# Altium footprint library SparkFun-Retired.PCBLIB: 302 footprints (part 9 of 19)
Each footprint in its own frame and in the unit in brackets; x right, y up, seen from the top. Pads: shape width x height; smd on the part's side, far side on the other; paste and mask are expansions set on the pad; w line width, h text height; cw(c..) or ccw(c..) is an arc to the next point about the centre after c.
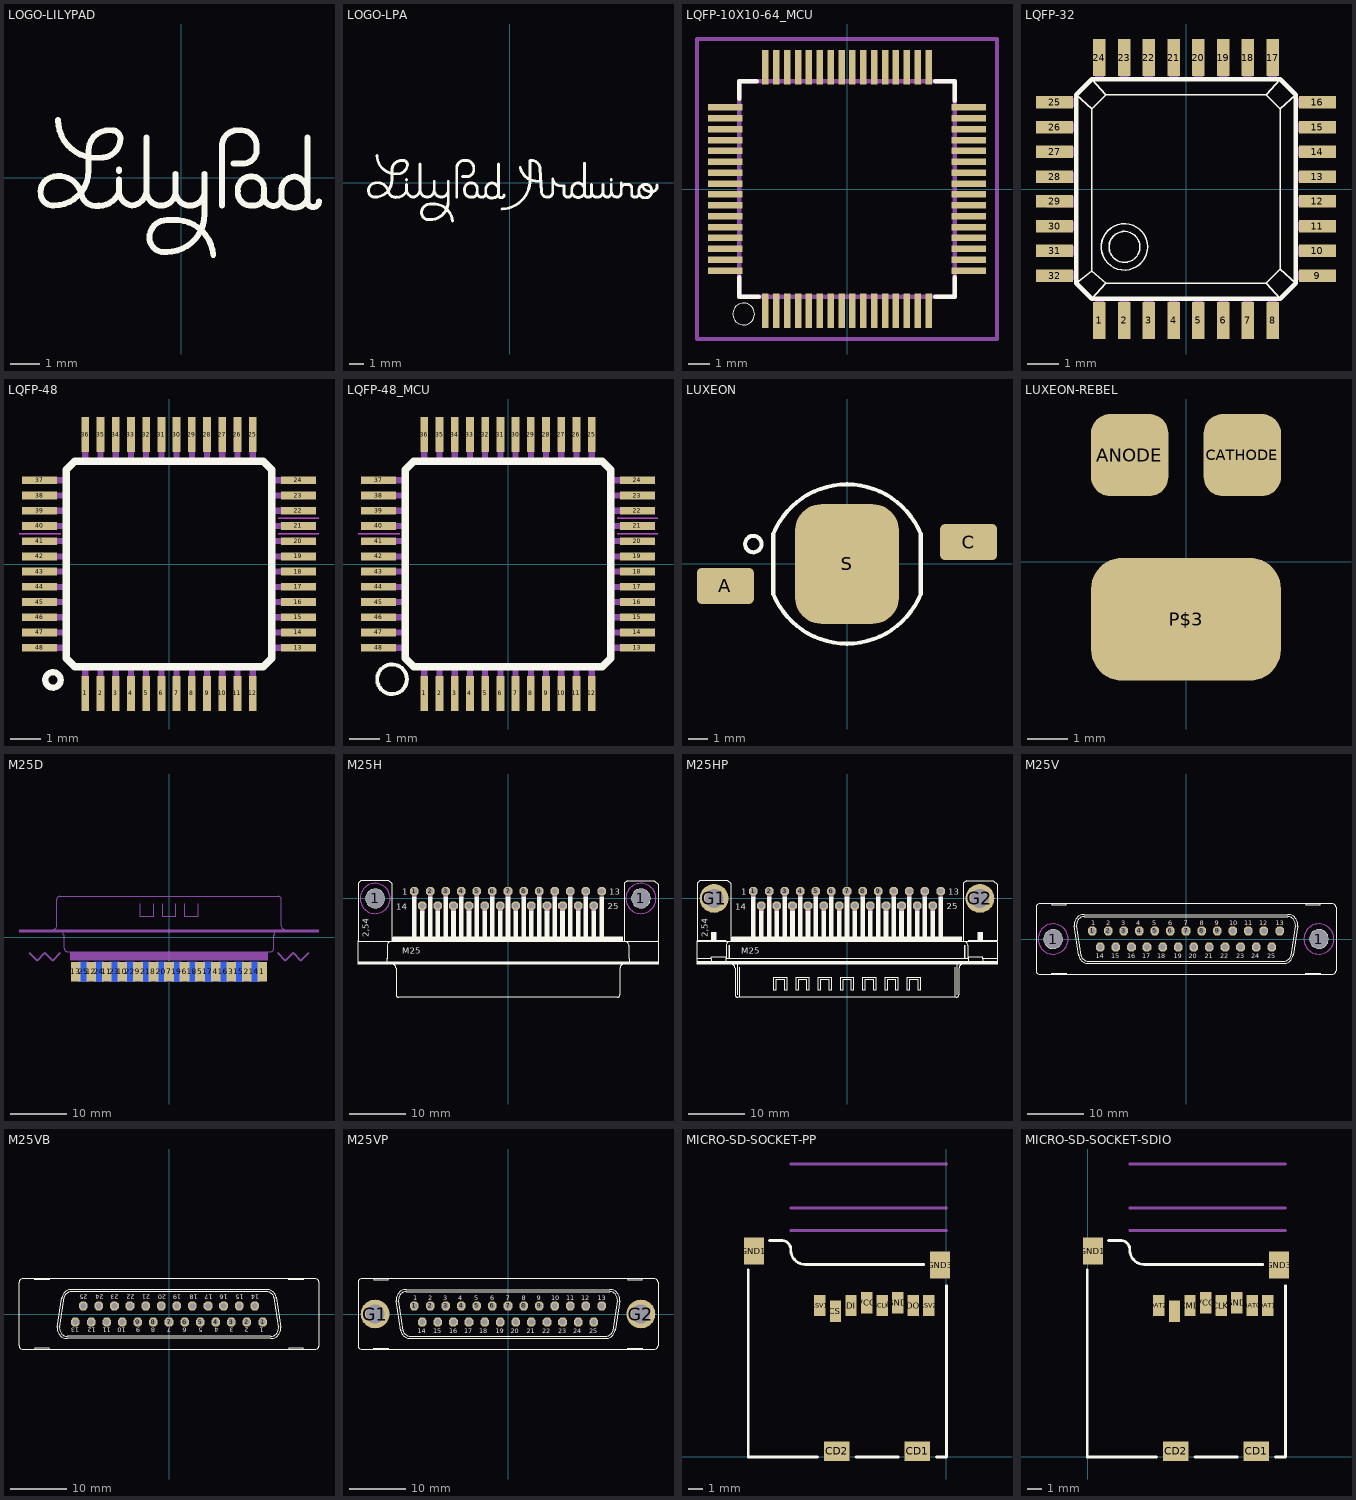
[diagram p8: the footprints below, top view; thin cyan lines are the x and y axes]

## LOGO-LILYPAD [mil]
Top Overlay:
  lines w8: -166.93,78.15 ccw(c-115.75,78.15) -115.75,26.97 -109.84,26.97 ccw(c-108.86,53.55) -82.28,52.56 ccw(c-94.09,52.56) -94.09,64.37 -98.03,64.37 ccw(c-98.03,36.81) -125.59,36.81 -125.59,9.25 cw(c-172.83,9.25) -172.83,-37.99 cw(c-173.81,-21.25) -190.55,-22.24 cw(c-169.88,-19.29) -172.83,1.38 cw(c-165.94,-29.13) -135.43,-22.24 ccw(c-115.75,-18.3) -111.81,-37.99 ; -125.59,-36.02 ccw(c-112.79,-7.48) -84.25,-20.28 -84.25,-14.37 ; -84.25,-2.56 -84.25,-14.37 ; -84.25,9.25 -84.25,11.22 ; -46.85,54.53 -46.85,-10.43 cw(c-85.26,-13.38) -46.85,-16.34 ; -7.48,5.32 -7.48,-18.31 ; 31.89,5.32 31.89,-18.31 ; 43.7,-104.92 ccw(c-7.48,-108.86) -11.42,-57.68 -19.29,-57.68 ccw(c-19.29,-81.3) -42.91,-81.3 ccw(c-23.23,-81.3) -23.23,-100.98 -19.29,-100.98 ccw(c-19.29,-49.8) 31.89,-49.8 31.89,-18.31 ; 55.51,-37.99 55.51,44.69 cw(c77.16,42.72) 79.13,64.37 cw(c81.1,42.71) 102.76,44.69 102.76,36.81 cw(c84.05,37.8) 83.07,19.09 71.26,19.09 ; 171.65,-24.21 171.65,54.53 ; 187.4,-32.09 cw(c179.53,-32.09) 179.53,-39.96 cw(c179.53,-32.09) 171.65,-32.09 171.65,-28.15 ; -84.25,-14.37 ccw(c-63.59,-17.32) -66.54,-37.99 ccw(c-69.32,-15.68) -46.85,-16.34 ; -46.85,-16.34 -46.85,-18.31 ccw(c-27.17,-18.31) -27.17,-37.99 ccw(c-27.16,-18.3) -7.48,-18.31 ; -7.48,-18.31 ccw(c12.2,-18.31) 12.2,-37.99 ccw(c12.21,-18.3) 31.89,-18.31 ; 112.6,-22.24 cw(c98.82,-24.21) 100.79,-37.99 92.91,-37.99 cw(c94.88,-20.28) 77.17,-18.31 cw(c94.89,-16.34) 92.91,1.38 96.85,1.38 cw(c96.85,-14.37) 112.6,-14.37 112.6,-22.24 ; 112.6,-22.24 ccw(c125.39,-25.2) 122.44,-37.99 ccw(c125.39,-27.16) 136.22,-30.12 136.22,-28.15 ; 136.22,-28.15 136.22,-18.31 cw(c154.93,-17.32) 153.94,1.38 cw(c151.97,-18.3) 171.65,-20.28 cw(c155.91,-24.21) 171.65,-28.15 ; 136.22,-28.15 ccw(c153.94,-22.25) 159.84,-39.96 ccw(c155.9,-24.21) 171.65,-28.15

## LOGO-LPA [mil]
Top Overlay:
  lines w8: -370.87,76.77 ccw(c-319.69,76.77) -319.69,25.59 -313.78,25.59 ccw(c-312.8,52.16) -286.22,51.18 ccw(c-298.03,51.18) -298.03,62.99 -301.97,62.99 ccw(c-301.97,35.43) -329.53,35.43 -329.53,7.87 cw(c-376.77,7.87) -376.77,-39.37 cw(c-377.75,-22.64) -394.49,-23.62 cw(c-373.82,-20.67) -376.77,0 cw(c-369.88,-30.51) -339.37,-23.62 ccw(c-319.69,-19.68) -315.75,-39.37 ; -329.53,-37.4 ccw(c-316.74,-8.86) -288.19,-21.65 -288.19,-15.75 ; -288.19,-3.94 -288.19,-15.75 ; -288.19,7.87 -288.19,9.84 ; -250.79,53.15 -250.79,-11.81 cw(c-289.2,-14.77) -250.79,-17.72 ; -211.42,3.94 -211.42,-19.69 ; -172.05,3.94 -172.05,-19.69 ; -160.24,-106.3 ccw(c-211.41,-110.23) -215.35,-59.06 -223.23,-59.06 ccw(c-223.23,-82.68) -246.85,-82.68 ccw(c-227.17,-82.68) -227.17,-102.36 -223.23,-102.36 ccw(c-223.23,-51.18) -172.05,-51.18 -172.05,-19.69 ; -148.43,-39.37 -148.43,43.31 cw(c-126.78,41.34) -124.8,62.99 cw(c-122.83,41.34) -101.18,43.31 -101.18,35.43 cw(c-119.88,36.42) -120.87,17.72 -132.68,17.72 ; -32.28,-25.59 -32.28,53.15 ; -22.44,-72.83 ccw(c-25.39,8.86) 56.3,11.81 56.3,62.99 60.24,62.99 cw(c60.24,39.37) 83.86,39.37 87.8,-23.62 ccw(c103.55,-23.62) 103.54,-39.37 ccw(c105.51,-25.59) 119.29,-27.56 119.29,11.81 ccw(c140.94,13.78) 142.91,-7.87 150.79,-7.87 150.79,-29.53 ccw(c160.63,-29.53) 160.63,-39.37 ; -16.54,-33.46 cw(c-24.41,-33.47) -24.41,-41.34 cw(c-24.41,-33.47) -32.28,-33.46 -32.28,-29.53 ; 28.74,43.31 ccw(c75.98,53.16) 85.83,5.91 ; 162.6,-39.37 ccw(c162.6,-29.53) 172.44,-29.53 172.44,-27.56 ; 207.87,-23.62 207.87,55.12 ; 227.56,-31.5 cw(c219.69,-31.5) 219.69,-39.37 cw(c217.72,-29.52) 207.87,-31.5 207.87,-27.56 ; 227.56,-3.94 227.56,-27.56 ccw(c242.32,-24.61) 245.28,-39.37 ccw(c244.29,-24.61) 259.06,-23.62 ; 259.06,-3.94 259.06,-23.62 ; 282.68,-3.94 282.68,-21.65 ; 282.68,7.87 282.68,9.84 ; 310.24,0 310.24,-27.56 ; 359.45,-27.56 cw(c349.61,-29.52) 351.57,-39.37 345.67,-39.37 cw(c347.63,-31.5) 339.76,-29.53 339.76,-13.78 ccw(c328.94,-14.77) 327.95,-3.94 322.05,-3.94 ccw(c322.05,-15.75) 310.24,-15.75 310.24,-27.56 ; 369.29,-5.91 ccw(c390.94,-1.97) 394.88,-23.62 ; 410.63,-5.91 410.63,-11.81 cw(c395.87,-8.86) 392.91,-23.62 394.88,-23.62 ; -288.19,-15.75 ccw(c-267.52,-18.7) -270.47,-39.37 ccw(c-273.25,-17.07) -250.79,-17.72 ; -250.79,-17.72 -250.79,-19.69 ccw(c-231.1,-19.68) -231.1,-39.37 ccw(c-231.1,-19.69) -211.42,-19.69 ; -211.42,-19.69 ccw(c-191.74,-19.68) -191.73,-39.37 ccw(c-191.73,-19.69) -172.05,-19.69 ; -91.34,-23.62 cw(c-105.12,-25.59) -103.15,-39.37 -111.02,-39.37 cw(c-109.06,-21.66) -126.77,-19.69 cw(c-109.05,-17.72) -111.02,0 -107.09,0 cw(c-107.09,-15.75) -91.34,-15.75 -91.34,-23.62 ; -91.34,-23.62 ccw(c-78.55,-26.57) -81.5,-39.37 ccw(c-78.55,-28.55) -67.72,-31.5 -67.72,-29.53 ; -67.72,-29.53 -67.72,-19.69 cw(c-49.02,-18.7) -50,0 cw(c-51.97,-19.68) -32.28,-21.65 cw(c-48.04,-25.59) -32.28,-29.53 ; -67.72,-29.53 ccw(c-50,-23.62) -44.09,-41.34 ccw(c-48.03,-25.59) -32.28,-29.53 ; 172.44,-27.56 172.44,-17.72 cw(c190.16,-17.72) 190.16,0 cw(c189.17,-18.7) 207.87,-19.69 cw(c192.13,-23.62) 207.87,-27.56 ; 172.44,-27.56 ccw(c190.16,-21.66) 196.06,-39.37 ccw(c192.12,-23.62) 207.87,-27.56 ; 259.06,-23.62 ccw(c272.84,-25.59) 270.87,-39.37 ccw(c270.87,-27.56) 282.68,-27.56 282.68,-21.65 ; 282.68,-21.65 282.68,-23.62 ccw(c298.43,-23.62) 298.43,-39.37 ccw(c298.43,-27.56) 310.24,-27.56 ; 394.88,-23.62 394.88,-19.69 ccw(c379.13,-19.69) 379.13,-3.94 375.2,-3.94 ccw(c377.17,-21.66) 359.45,-23.62 ccw(c376.19,-24.61) 375.2,-41.34 379.13,-41.34 ccw(c378.14,-24.61) 394.88,-23.62

## LQFP-10X10-64_MCU [mil]
pads (64):
  rect 11.81x62.99 smd: 1(-147.64,-220.47) 2(-127.95,-220.47) 3(-108.27,-220.47) 4(-88.58,-220.47) 5(-68.9,-220.47) 6(-49.21,-220.47) 7(-29.53,-220.47) 8(-9.84,-220.47) 9(9.84,-220.47) 10(29.53,-220.47) 11(49.21,-220.47) 12(68.9,-220.47) 13(88.58,-220.47) 14(108.27,-220.47) 15(127.95,-220.47) 16(147.64,-220.47) 33(147.64,220.47) 34(127.95,220.47) 35(108.27,220.47) 36(88.58,220.47) 37(68.9,220.47) 38(49.21,220.47) 39(29.53,220.47) 40(9.84,220.47) 41(-9.84,220.47) 42(-29.53,220.47) 43(-49.21,220.47) 44(-68.9,220.47) 45(-88.58,220.47) 46(-108.27,220.47) 47(-127.95,220.47) 48(-147.64,220.47)
  rect 62.99x11.81 smd: 17(220.47,-147.64) 18(220.47,-127.95) 19(220.47,-108.27) 20(220.47,-88.58) 21(220.47,-68.9) 22(220.47,-49.21) 23(220.47,-29.53) 24(220.47,-9.84) 25(220.47,9.84) 26(220.47,29.53) 27(220.47,49.21) 28(220.47,68.9) 29(220.47,88.58) 30(220.47,108.27) 31(220.47,127.95) 32(220.47,147.64) 49(-220.47,147.64) 50(-220.47,127.95) 51(-220.47,108.27) 52(-220.47,88.58) 53(-220.47,68.9) 54(-220.47,49.21) 55(-220.47,29.53) 56(-220.47,9.84) 57(-220.47,-9.84) 58(-220.47,-29.53) 59(-220.47,-49.21) 60(-220.47,-68.9) 61(-220.47,-88.58) 62(-220.47,-108.27) 63(-220.47,-127.95) 64(-220.47,-147.64)
Top Overlay:
  circle w0: c-187.01,-226.38 r19.69
  lines w8: -194.88,-159.45 -194.88,-194.88 -159.45,-194.88 ; -194.88,163.39 -194.88,194.88 -163.39,194.88 ; 159.45,-194.88 194.88,-194.88 194.88,-159.45 ; 159.45,194.88 194.88,194.88 194.88,159.45
Top Paste:
  rectangle: -238.9,142.3 -198.7,153
  rectangle: -248.3,122.6 -208.1,133.3
  rectangle: -238.9,102.9 -198.7,113.6
  rectangle: -248.3,83.2 -208.1,93.9
  rectangle: -238.9,63.6 -198.7,74.3
  rectangle: -248.3,43.9 -208.1,54.6
  rectangle: -238.9,24.4 -198.7,35.1
  rectangle: -248.3,4.7 -208.1,15.4
  rectangle: -238.9,-15.2 -198.7,-4.5
  rectangle: -248.3,-34.9 -208.1,-24.2
  rectangle: -238.9,-54.5 -198.7,-43.8
  rectangle: -248.3,-74.2 -208.1,-63.5
  rectangle: -238.9,-93.9 -198.7,-83.2
  rectangle: -248.3,-113.6 -208.1,-102.9
  rectangle: -238.9,-133.2 -198.7,-122.5
  rectangle: -248.3,-152.9 -208.1,-142.2
  rectangle: 208.2,142.2 248.4,152.9
  rectangle: 198.8,122.5 239,133.2
  rectangle: 208.2,102.8 248.4,113.5
  rectangle: 198.8,83.1 239,93.8
  rectangle: 208.2,63.5 248.4,74.2
  rectangle: 198.8,43.8 239,54.5
  rectangle: 208.2,24.3 248.4,35
  rectangle: 198.8,4.6 239,15.3
  rectangle: 208.2,-15.3 248.4,-4.6
  rectangle: 198.8,-35 239,-24.3
  rectangle: 208.2,-54.6 248.4,-43.9
  rectangle: 198.8,-74.3 239,-63.6
  rectangle: 208.2,-94 248.4,-83.3
  rectangle: 198.8,-113.7 239,-103
  rectangle: 208.2,-133.3 248.4,-122.6
  rectangle: 198.8,-153 239,-142.3
  region: -142.2,208.4 -142.2,248.6 -152.9,248.6 -152.9,208.4
  region: -122.5,199 -122.5,239.2 -133.2,239.2 -133.2,199
  region: -102.8,208.4 -102.8,248.6 -113.5,248.6 -113.5,208.4
  region: -83.1,199 -83.1,239.2 -93.8,239.2 -93.8,199
  region: -63.5,208.4 -63.5,248.6 -74.2,248.6 -74.2,208.4
  region: -43.8,199 -43.8,239.2 -54.5,239.2 -54.5,199
  region: -24.3,208.4 -24.3,248.6 -35,248.6 -35,208.4
  region: -4.6,199 -4.6,239.2 -15.3,239.2 -15.3,199
  region: 15.3,208.4 15.3,248.6 4.6,248.6 4.6,208.4
  region: 35,199 35,239.2 24.3,239.2 24.3,199
  region: 54.6,208.4 54.6,248.6 43.9,248.6 43.9,208.4
  region: 74.3,199 74.3,239.2 63.6,239.2 63.6,199
  region: 94,208.4 94,248.6 83.3,248.6 83.3,208.4
  region: 113.7,199 113.7,239.2 103,239.2 103,199
  region: 133.3,208.4 133.3,248.6 122.6,248.6 122.6,208.4
  region: 153,199 153,239.2 142.3,239.2 142.3,199
  region: -142.3,-237.5 -142.3,-197.3 -153,-197.3 -153,-237.5
  region: -122.6,-246.9 -122.6,-206.7 -133.3,-206.7 -133.3,-246.9
  region: -102.9,-237.5 -102.9,-197.3 -113.6,-197.3 -113.6,-237.5
  region: -83.2,-246.9 -83.2,-206.7 -93.9,-206.7 -93.9,-246.9
  region: -63.6,-237.5 -63.6,-197.3 -74.3,-197.3 -74.3,-237.5
  region: -43.9,-246.9 -43.9,-206.7 -54.6,-206.7 -54.6,-246.9
  region: -24.4,-237.5 -24.4,-197.3 -35.1,-197.3 -35.1,-237.5
  region: -4.7,-246.9 -4.7,-206.7 -15.4,-206.7 -15.4,-246.9
  region: 15.2,-237.5 15.2,-197.3 4.5,-197.3 4.5,-237.5
  region: 34.9,-246.9 34.9,-206.7 24.2,-206.7 24.2,-246.9
  region: 54.5,-237.5 54.5,-197.3 43.8,-197.3 43.8,-237.5
  region: 74.2,-246.9 74.2,-206.7 63.5,-206.7 63.5,-246.9
  region: 93.9,-237.5 93.9,-197.3 83.2,-197.3 83.2,-237.5
  region: 113.6,-246.9 113.6,-206.7 102.9,-206.7 102.9,-246.9
  region: 133.2,-237.5 133.2,-197.3 122.5,-197.3 122.5,-237.5
  region: 152.9,-246.9 152.9,-206.7 142.2,-206.7 142.2,-246.9
Mechanical 16:
  rectangle: 6.5,-233.27 13.19,-194.88
  rectangle: 194.88,6.5 233.27,13.19
  rectangle: 6.5,194.88 13.19,233.27
  rectangle: -233.27,6.5 -194.88,13.19
  rectangle: -13.19,194.88 -6.5,233.27
  rectangle: -32.87,194.88 -26.18,233.27
  rectangle: 26.18,194.88 32.87,233.27
  rectangle: 45.87,194.88 52.56,233.27
  rectangle: 65.55,194.88 72.24,233.27
  rectangle: 85.24,194.88 91.93,233.27
  rectangle: 104.92,194.88 111.61,233.27
  rectangle: 124.61,194.88 131.3,233.27
  rectangle: 144.29,194.88 150.98,233.27
  rectangle: -52.56,194.88 -45.87,233.27
  rectangle: -72.24,194.88 -65.55,233.27
  rectangle: -91.93,194.88 -85.24,233.27
  rectangle: -111.61,194.88 -104.92,233.27
  rectangle: -131.3,194.88 -124.61,233.27
  rectangle: -150.98,194.88 -144.29,233.27
  rectangle: 194.88,26.18 233.27,32.87
  rectangle: 194.88,45.87 233.27,52.56
  rectangle: 194.88,65.55 233.27,72.24
  rectangle: 194.88,85.24 233.27,91.93
  rectangle: 194.88,104.92 233.27,111.61
  rectangle: 194.88,124.61 233.27,131.3
  rectangle: 194.88,144.29 233.27,150.98
  rectangle: 194.88,-13.19 233.27,-6.5
  rectangle: 194.88,-32.87 233.27,-26.18
  rectangle: 194.88,-52.56 233.27,-45.87
  rectangle: 194.88,-72.24 233.27,-65.55
  rectangle: 194.88,-91.93 233.27,-85.24
  rectangle: 194.88,-111.61 233.27,-104.92
  rectangle: 194.88,-131.3 233.27,-124.61
  rectangle: 194.88,-150.98 233.27,-144.29
  rectangle: -13.19,-233.27 -6.5,-194.88
  rectangle: -32.87,-233.27 -26.18,-194.88
  rectangle: -52.56,-233.27 -45.87,-194.88
  rectangle: -72.24,-233.27 -65.55,-194.88
  rectangle: -150.98,-233.27 -144.29,-194.88
  rectangle: -131.3,-233.27 -124.61,-194.88
  rectangle: -111.61,-233.27 -104.92,-194.88
  rectangle: -91.93,-233.27 -85.24,-194.88
  rectangle: 26.18,-233.27 32.87,-194.88
  rectangle: 45.87,-233.27 52.56,-194.88
  rectangle: 144.29,-233.27 150.98,-194.88
  rectangle: 124.61,-233.27 131.3,-194.88
  rectangle: 104.92,-233.27 111.61,-194.88
  rectangle: 85.24,-233.27 91.93,-194.88
  rectangle: 65.55,-233.27 72.24,-194.88
  rectangle: -233.27,144.29 -194.88,150.98
  rectangle: -233.27,-150.98 -194.88,-144.29
  rectangle: -233.27,-131.3 -194.88,-124.61
  rectangle: -233.27,-111.61 -194.88,-104.92
  rectangle: -233.27,-91.93 -194.88,-85.24
  rectangle: -233.27,-72.24 -194.88,-65.55
  rectangle: -233.27,-52.56 -194.88,-45.87
  rectangle: -233.27,-32.87 -194.88,-26.18
  rectangle: -233.27,-13.19 -194.88,-6.5
  rectangle: -233.27,26.18 -194.88,32.87
  rectangle: -233.27,124.61 -194.88,131.3
  rectangle: -233.27,104.92 -194.88,111.61
  rectangle: -233.27,85.24 -194.88,91.93
  rectangle: -233.27,65.55 -194.88,72.24
  rectangle: -233.27,45.87 -194.88,52.56
  lines w8: -194.88,-194.88 194.88,-194.88 194.88,194.88 -194.88,194.88 -194.88,-194.88
Mechanical 27:
  lines w7.87: -271.65,-271.65 -271.65,271.65 271.65,271.65 271.65,-271.65 -271.65,-271.65

## LQFP-32 [mm]
pads (32):
  rect 0.4x1.2 smd: 1(-2.8,-4.25) 2(-2,-4.25) 3(-1.2,-4.25) 4(-0.4,-4.25) 5(0.4,-4.25) 6(1.2,-4.25) 7(2,-4.25) 8(2.8,-4.25) 17(2.8,4.25) 18(2,4.25) 19(1.2,4.25) 20(0.4,4.25) 21(-0.4,4.25) 22(-1.2,4.25) 23(-2,4.25) 24(-2.8,4.25)
  rect 1.2x0.4 smd: 9(4.25,-2.8) 10(4.25,-2) 11(4.25,-1.2) 12(4.25,-0.4) 13(4.25,0.4) 14(4.25,1.2) 15(4.25,2) 16(4.25,2.8) 25(-4.25,2.8) 26(-4.25,2) 27(-4.25,1.2) 28(-4.25,0.4) 29(-4.25,-0.4) 30(-4.25,-1.2) 31(-4.25,-2) 32(-4.25,-2.8)
Top Overlay:
  circle w0.051: c-1.99,-1.871 r0.75
  circle w0.051: c-1.99,-1.871 r0.5
  lines w0.051: -3.55,-3.05 -3.05,-2.65 ; -3.55,3.05 -3.05,2.59 ; -3.05,-3.55 -2.59,-3.05 ; -3.05,3.55 -2.59,3.05 ; 3.05,-3.55 2.59,-3.05 ; 3.05,3.55 2.59,3.05 ; 3.55,-3.05 3.05,-2.59 ; 3.55,3.05 3.05,2.59 ; -3.05,-2.65 -3.05,2.59 ; -3.05,-2.65 -2.59,-3.05 ; -3.05,2.59 -2.59,3.05 ; -2.59,-3.05 2.59,-3.05 ; -2.59,3.05 2.59,3.05 ; 2.59,-3.05 3.05,-2.59 ; 2.59,3.05 3.05,2.59 ; 3.05,-2.59 3.05,2.59
  lines w0.152: -3.55,-3.05 -3.05,-3.55 3.05,-3.55 3.55,-3.05 3.55,3.05 3.05,3.55 -3.05,3.55 -3.55,3.05 -3.55,-3.05
Mechanical 16:
  rectangle: -2.95,3.55 -2.65,4.5
  rectangle: -2.15,3.55 -1.85,4.5
  rectangle: -1.35,3.55 -1.05,4.5
  rectangle: -0.55,3.55 -0.25,4.5
  rectangle: 0.25,3.55 0.55,4.5
  rectangle: 1.05,3.55 1.35,4.5
  rectangle: 1.85,3.55 2.15,4.5
  rectangle: 2.65,3.55 2.95,4.5
  rectangle: 3.55,2.65 4.5,2.95
  rectangle: 3.55,1.85 4.5,2.15
  rectangle: 3.55,1.05 4.5,1.35
  rectangle: 3.55,0.25 4.5,0.55
  rectangle: 3.55,-0.55 4.5,-0.25
  rectangle: 3.55,-1.35 4.5,-1.05
  rectangle: 3.55,-2.15 4.5,-1.85
  rectangle: 3.55,-2.95 4.5,-2.65
  rectangle: 2.65,-4.5 2.95,-3.55
  rectangle: 1.85,-4.5 2.15,-3.55
  rectangle: 1.05,-4.5 1.35,-3.55
  rectangle: 0.25,-4.5 0.55,-3.55
  rectangle: -0.55,-4.5 -0.25,-3.55
  rectangle: -1.35,-4.5 -1.05,-3.55
  rectangle: -2.15,-4.5 -1.85,-3.55
  rectangle: -2.95,-4.5 -2.65,-3.55
  rectangle: -4.5,-2.95 -3.55,-2.65
  rectangle: -4.5,-2.15 -3.55,-1.85
  rectangle: -4.5,-1.35 -3.55,-1.05
  rectangle: -4.5,-0.6 -3.55,-0.25
  rectangle: -4.5,0.2 -3.55,0.55
  rectangle: -4.5,1.05 -3.55,1.35
  rectangle: -4.5,1.85 -3.55,2.15
  rectangle: -4.5,2.65 -3.55,2.95

## LQFP-48 [mil]
pads (48):
  rect 10x45 smd: 1(-108.27,-167.32) 2(-88.58,-167.32) 3(-68.9,-167.32) 4(-49.21,-167.32) 5(-29.53,-167.32) 6(-9.84,-167.32) 7(9.84,-167.32) 8(29.53,-167.32) 9(49.21,-167.32) 10(68.9,-167.32) 11(88.58,-167.32) 12(108.27,-167.32) 25(108.27,167.32) 26(88.58,167.32) 27(68.9,167.32) 28(49.21,167.32) 29(29.53,167.32) 30(9.84,167.32) 31(-9.84,167.32) 32(-29.53,167.32) 33(-49.21,167.32) 34(-68.9,167.32) 35(-88.58,167.32) 36(-108.27,167.32)
  rect 45x10 smd: 13(167.32,-108.27) 14(167.32,-88.58) 15(167.32,-68.9) 16(167.32,-49.21) 17(167.32,-29.53) 18(167.32,-9.84) 19(167.32,9.84) 20(167.32,29.53) 21(167.32,49.21) 22(167.32,68.9) 23(167.32,88.58) 24(167.32,108.27) 37(-167.32,108.27) 38(-167.32,88.58) 39(-167.32,68.9) 40(-167.32,49.21) 41(-167.32,29.53) 42(-167.32,9.84) 43(-167.32,-9.84) 44(-167.32,-29.53) 45(-167.32,-49.21) 46(-167.32,-68.9) 47(-167.32,-88.58) 48(-167.32,-108.27)
Top Overlay:
  circle w8: c-150,-150 r10
  lines w10: -132.87,-122.05 -122.05,-132.87 122.05,-132.87 132.87,-122.05 132.87,122.05 122.05,132.87 -122.05,132.87 -132.87,122.05 -132.87,-122.05
Mechanical 8 keep-out:
  rectangle: 141,58 194,60
  rectangle: 141,38 194,40
  rectangle: -194,38 -140,40
Mechanical 16:
  rectangle: -112.2,-177.17 -104.33,-135.83
  rectangle: -92.52,-177.17 -84.65,-135.83
  rectangle: -72.83,-177.17 -64.96,-135.83
  rectangle: -53.15,-177.17 -45.28,-135.83
  rectangle: -33.46,-177.17 -25.59,-135.83
  rectangle: -13.78,-177.17 -5.91,-135.83
  rectangle: 5.91,-177.17 13.78,-135.83
  rectangle: 25.59,-177.17 33.46,-135.83
  rectangle: 45.28,-177.17 53.15,-135.83
  rectangle: 64.96,-177.17 72.83,-135.83
  rectangle: 84.65,-177.17 92.52,-135.83
  rectangle: 104.33,-177.17 112.2,-135.83
  rectangle: 135.83,-112.2 177.17,-104.33
  rectangle: 135.83,-92.52 177.17,-84.65
  rectangle: 135.83,-72.83 177.17,-64.96
  rectangle: 135.83,-53.15 177.17,-45.28
  rectangle: 135.83,-33.46 177.17,-25.59
  rectangle: 135.83,-13.78 177.17,-5.91
  rectangle: 135.83,5.91 177.17,13.78
  rectangle: 135.83,25.59 177.17,33.46
  rectangle: 135.83,45.28 177.17,53.15
  rectangle: 135.83,64.96 177.17,72.83
  rectangle: 135.83,84.65 177.17,92.52
  rectangle: 135.83,104.33 177.17,112.2
  rectangle: 104.33,135.83 112.2,177.17
  rectangle: 84.65,135.83 92.52,177.17
  rectangle: 64.96,135.83 72.83,177.17
  rectangle: 45.28,135.83 53.15,177.17
  rectangle: 25.59,135.83 33.46,177.17
  rectangle: 5.91,135.83 13.78,177.17
  rectangle: -13.78,135.83 -5.91,177.17
  rectangle: -33.46,135.83 -25.59,177.17
  rectangle: -53.15,135.83 -45.28,177.17
  rectangle: -72.83,135.83 -64.96,177.17
  rectangle: -92.52,135.83 -84.65,177.17
  rectangle: -112.2,135.83 -104.33,177.17
  rectangle: -177.17,104.33 -135.83,112.2
  rectangle: -177.17,84.65 -135.83,92.52
  rectangle: -177.17,64.96 -135.83,72.83
  rectangle: -177.17,45.28 -135.83,53.15
  rectangle: -177.17,25.59 -135.83,33.46
  rectangle: -177.17,5.91 -135.83,13.78
  rectangle: -177.17,-13.78 -135.83,-5.91
  rectangle: -177.17,-33.46 -135.83,-25.59
  rectangle: -177.17,-53.15 -135.83,-45.28
  rectangle: -177.17,-72.83 -135.83,-64.96
  rectangle: -177.17,-92.52 -135.83,-84.65
  rectangle: -177.17,-112.2 -135.83,-104.33

## LQFP-48_MCU [mil]
pads (48):
  rect 10x45 smd: 1(-108.27,-167.32) 2(-88.58,-167.32) 3(-68.9,-167.32) 4(-49.21,-167.32) 5(-29.53,-167.32) 6(-9.84,-167.32) 7(9.84,-167.32) 8(29.53,-167.32) 9(49.21,-167.32) 10(68.9,-167.32) 11(88.58,-167.32) 12(108.27,-167.32) 25(108.27,167.32) 26(88.58,167.32) 27(68.9,167.32) 28(49.21,167.32) 29(29.53,167.32) 30(9.84,167.32) 31(-9.84,167.32) 32(-29.53,167.32) 33(-49.21,167.32) 34(-68.9,167.32) 35(-88.58,167.32) 36(-108.27,167.32)
  rect 45x10 smd: 13(167.32,-108.27) 14(167.32,-88.58) 15(167.32,-68.9) 16(167.32,-49.21) 17(167.32,-29.53) 18(167.32,-9.84) 19(167.32,9.84) 20(167.32,29.53) 21(167.32,49.21) 22(167.32,68.9) 23(167.32,88.58) 24(167.32,108.27) 37(-167.32,108.27) 38(-167.32,88.58) 39(-167.32,68.9) 40(-167.32,49.21) 41(-167.32,29.53) 42(-167.32,9.84) 43(-167.32,-9.84) 44(-167.32,-29.53) 45(-167.32,-49.21) 46(-167.32,-68.9) 47(-167.32,-88.58) 48(-167.32,-108.27)
Top Overlay:
  circle w5: c-150,-149 r19.21
  lines w10: -132.87,-122.05 -122.05,-132.87 122.05,-132.87 132.87,-122.05 132.87,122.05 122.05,132.87 -122.05,132.87 -132.87,122.05 -132.87,-122.05
Mechanical 8 keep-out:
  rectangle: 141,58 194,60
  rectangle: 141,38 194,40
  rectangle: -194,38 -140,40
Mechanical 16:
  rectangle: -112.2,-177.17 -104.33,-135.83
  rectangle: -92.52,-177.17 -84.65,-135.83
  rectangle: -72.83,-177.17 -64.96,-135.83
  rectangle: -53.15,-177.17 -45.28,-135.83
  rectangle: -33.46,-177.17 -25.59,-135.83
  rectangle: -13.78,-177.17 -5.91,-135.83
  rectangle: 5.91,-177.17 13.78,-135.83
  rectangle: 25.59,-177.17 33.46,-135.83
  rectangle: 45.28,-177.17 53.15,-135.83
  rectangle: 64.96,-177.17 72.83,-135.83
  rectangle: 84.65,-177.17 92.52,-135.83
  rectangle: 104.33,-177.17 112.2,-135.83
  rectangle: 135.83,-112.2 177.17,-104.33
  rectangle: 135.83,-92.52 177.17,-84.65
  rectangle: 135.83,-72.83 177.17,-64.96
  rectangle: 135.83,-53.15 177.17,-45.28
  rectangle: 135.83,-33.46 177.17,-25.59
  rectangle: 135.83,-13.78 177.17,-5.91
  rectangle: 135.83,5.91 177.17,13.78
  rectangle: 135.83,25.59 177.17,33.46
  rectangle: 135.83,45.28 177.17,53.15
  rectangle: 135.83,64.96 177.17,72.83
  rectangle: 135.83,84.65 177.17,92.52
  rectangle: 135.83,104.33 177.17,112.2
  rectangle: 104.33,135.83 112.2,177.17
  rectangle: 84.65,135.83 92.52,177.17
  rectangle: 64.96,135.83 72.83,177.17
  rectangle: 45.28,135.83 53.15,177.17
  rectangle: 25.59,135.83 33.46,177.17
  rectangle: 5.91,135.83 13.78,177.17
  rectangle: -13.78,135.83 -5.91,177.17
  rectangle: -33.46,135.83 -25.59,177.17
  rectangle: -53.15,135.83 -45.28,177.17
  rectangle: -72.83,135.83 -64.96,177.17
  rectangle: -92.52,135.83 -84.65,177.17
  rectangle: -112.2,135.83 -104.33,177.17
  rectangle: -177.17,104.33 -135.83,112.2
  rectangle: -177.17,84.65 -135.83,92.52
  rectangle: -177.17,64.96 -135.83,72.83
  rectangle: -177.17,45.28 -135.83,53.15
  rectangle: -177.17,25.59 -135.83,33.46
  rectangle: -177.17,5.91 -135.83,13.78
  rectangle: -177.17,-13.78 -135.83,-5.91
  rectangle: -177.17,-33.46 -135.83,-25.59
  rectangle: -177.17,-53.15 -135.83,-45.28
  rectangle: -177.17,-72.83 -135.83,-64.96
  rectangle: -177.17,-92.52 -135.83,-84.65
  rectangle: -177.17,-112.2 -135.83,-104.33

## LUXEON [mm]
pads (3):
  rrect25% 2.85x1.8 smd: A(-6.1,-1.1) C(6.1,1.1)
  rrect50% 5.2x6 smd: S(0,0)
Top Overlay:
  circle w0.203: c-4.7,1 r0.412
  lines w0.203: -3.7,-1.5 -3.7,1.5 cw(c0.008,0) 0,4 cw(c-0.008,0) 3.7,1.5 3.7,-1.5 cw(c-0.008,0) 0,-4 cw(c0.008,0) -3.7,-1.5
Mechanical 16:
  text "+" at -6.35,2.54 h1.97
  text "-" at 5.08,-2.54 h1.97

## LUXEON-REBEL [mil]
pads (3):
  rrect50% 75.2x79.92 smd: ANODE(-54.72,103.54) CATHODE(54.72,103.54)
  rrect50% 184.25x119.29 smd: P$3(0,-55.91)

## M25D [mil]
pads (25):
  rect 66.93x137.8 smd: 1(648.01,-237.98) 2(540,-237.99) 3(431.99,-237.98) 4(324.01,-237.98) 5(215.99,-237.98) 6(108.01,-237.98) 7(0,-237.99) 8(-108.01,-237.98) 9(-215.99,-237.98) 10(-324.01,-237.98) 11(-431.99,-237.98) 12(-540,-237.99) 13(-648.01,-237.98)
  rect 66.93x137.8 smd far side: 14(594,-238) 15(486,-238) 16(378,-238) 17(270,-238) 18(162,-238) 19(54,-238) 20(-54,-238) 21(-162,-238) 22(-270,-238) 23(-378,-238) 24(-486,-238) 25(-594,-238)
Mechanical 16:
  rectangle: -1043.31,35.43 1043.31,55.12
  rectangle: -688.98,-161.42 688.98,-98.43
  lines w6: -805,55.55 ccw(c-805,80.55) -780,80.55 -780,265.55 cw(c-760,265.55) -760,285.55 760,285.55 cw(c760,265.55) 780,265.55 780,80.55 ccw(c805,80.55) 805,55.55 ; -734,40 -734,20 -729,20 -729,-75 ccw(c-704,-75) -704,-100 ; -704.76,-100 704,-100 ; -200,234.45 -200,144.45 -110,144.45 -110,234.45 ; -45,234.45 -45,144.45 45,144.45 45,234.45 ; 110,234.45 110,144.45 200,144.45 200,234.45 ; 704.76,-100 704,-100 ; 734,40 734,20 729,20 729,-75 cw(c704,-75) 704,-100
  text "1" at 630.93,-85.77 h42.5
  text "13" at -663.8,-85.77 h42.5
  text "M25D" at -678,181 h42.5
Mechanical 30:
  lines w10: -972,-108 -918,-162 -864,-108 -810,-162 -756,-108 ; 756,-108 810,-162 864,-108 918,-162 972,-108
  text "Board" at 774,-100 h42.5
  text "25" at -577.19,-32.48 h42.5
  text "14" at 615.18,-32.48 h42.5
  text "Board" at -974,-100 h42.5

## M25H [mil]
pads (27):
  round 130 hole 130: 1(-926,0) 1(926,0)
  oct 60x60 hole 40: 1(-652,50) 2(-543,50) 3(-435,50) 4(-326,50) 5(-217,50) 6(-109,50) 7(0,50) 8(109,50) 9(217,50) 10(326,50) 11(435,50) 12(543,50) 13(652,50) 14(-598,-50) 15(-489,-50) 16(-380,-50) 17(-272,-50) 18(-163,-50) 19(-54,-50) 20(54,-50) 21(163,-50) 22(272,-50) 23(380,-50) 24(489,-50) 25(598,-50)
Top Overlay:
  circle w6: c926,0 r65
  circle w6: c-926,0 r65
  rectangle: -1045,-460 1045,-440
  rectangle: -800,-300 800,-270
  rectangle: -668,-270 -636,15
  rectangle: -614,-270 -582,-85
  rectangle: -559,-270 -527,15
  rectangle: -505,-270 -473,-85
  rectangle: -451,-270 -419,15
  rectangle: -396,-270 -364,-85
  rectangle: -342,-270 -310,15
  rectangle: -288,-270 -256,-85
  rectangle: -233,-270 -201,15
  rectangle: -179,-270 -147,-85
  rectangle: -125,-270 -93,15
  rectangle: -70,-270 -38,-85
  rectangle: -16,-270 16,15
  rectangle: 38,-270 70,-85
  rectangle: 93,-270 125,15
  rectangle: 147,-270 179,-85
  rectangle: 201,-270 233,15
  rectangle: 256,-270 288,-85
  rectangle: 310,-270 342,15
  rectangle: 364,-270 396,-85
  rectangle: 419,-270 451,15
  rectangle: 473,-270 505,-85
  rectangle: 527,-270 559,15
  rectangle: 582,-270 614,-85
  rectangle: 636,-270 668,15
  lines w6: -845,-440 -845,-420 -840,-420 -840,-325 cw(c-815,-325) -815,-300 ; -805,-460 cw(c-805,-485) -780,-485 -780,-670 ccw(c-760,-670) -760,-690 -750,-690 750,-690 760,-690 ccw(c760,-670) 780,-670 780,-485 cw(c805,-485) 805,-460 ; 815,-300 cw(c815,-325) 840,-325 840,-420 845,-420 845,-440 ; -1045,-300 -1045,-420 -1045,-440 -1045,-460 -765,-460 765,-460 1045,-460 1045,-440 1045,-420 1045,-300 ; -1045,-300 -1045,-295 -1045,105 -1025,125 -830,125 -810,105 -810,-300 ; -1045,-300 -845,-300 -810,-300 ; -810,-300 -800,-300 ; -800,-300 800,-300 ; -800,-300 -800,-270 800,-270 800,-300 ; 800,-300 810,-300 ; 810,-300 845,-300 1045,-300 ; 810,-300 810,105 830,125 1020,125 1045,100 1045,-295 1045,-300
  text "1" at -735,25 h42.5
  text "13" at 705,25 h42.5
  text "14" at -780,-80 h42.5
  text "25" at 695,-75 h42.5
  text "2,54" at -970,-270 h42.5
  text "M25" at -735,-385 h42.5
Mechanical 9 keep-out:
  circle w0: c926,0 r105
  circle w0: c-926,0 r105
Mechanical 10:
  circle w0: c926,0 r105
  circle w0: c-926,0 r105
Mechanical 16:
  lines w6: 652,5 652,45
  lines w32: -652,5 -652,45 ; -598,-94 -598,-54 ; -543,5 -543,45 ; -489,-94 -489,-54 ; -435,5 -435,45 ; -380,-94 -380,-54 ; -326,5 -326,45 ; -272,-95 -272,-55 ; -217,5 -217,45 ; -163,-95 -163,-55 ; -109,5 -109,45 ; -54,-95 -54,-55 ; 0,5 0,45 ; 54,-95 54,-55 ; 109,5 109,45 ; 163,-95 163,-55 ; 217,5 217,45 ; 272,-95 272,-55 ; 326,5 326,45 ; 380,-95 380,-55 ; 435,5 435,45 ; 489,-95 489,-55 ; 543,5 543,45 ; 598,-95 598,-55

## M25HP [mil]
pads (27):
  oct 60x60 hole 40: 1(-652,50) 2(-543,50) 3(-435,50) 4(-326,50) 5(-217,50) 6(-109,50) 7(0,50) 8(109,50) 9(217,50) 10(326,50) 11(435,50) 12(543,50) 13(652,50) 14(-598,-50) 15(-489,-50) 16(-380,-50) 17(-272,-50) 18(-163,-50) 19(-54,-50) 20(54,-50) 21(163,-50) 22(272,-50) 23(380,-50) 24(489,-50) 25(598,-50)
  round 200 hole 130: G1(-926,0) G2(926,0)
Top Overlay:
  drawing of 161 lines, arcs and shapes, not listed
  text "1" at -735,25 h42.5
  text "13" at 705,25 h42.5
  text "14" at -780,-80 h42.5
  text "25" at 695,-75 h42.5
  text "2,54" at -970,-270 h42.5
  text "M25" at -735,-385 h42.5
Mechanical 16:
  lines w6: 652,5 652,45
  lines w32: -652,5 -652,45 ; -598,-94 -598,-54 ; -543,5 -543,45 ; -489,-94 -489,-54 ; -435,5 -435,45 ; -380,-94 -380,-54 ; -326,5 -326,45 ; -272,-95 -272,-55 ; -217,5 -217,45 ; -163,-95 -163,-55 ; -109,5 -109,45 ; -54,-95 -54,-55 ; 0,5 0,45 ; 54,-95 54,-55 ; 109,5 109,45 ; 163,-95 163,-55 ; 217,5 217,45 ; 272,-95 272,-55 ; 326,5 326,45 ; 380,-95 380,-55 ; 435,5 435,45 ; 489,-95 489,-55 ; 543,5 543,45 ; 598,-95 598,-55

## M25V [mil]
pads (27):
  round 130 hole 130: 1(-926,0) 1(926,0)
  oct 60x60 hole 40: 1(-652,56) 2(-543,56) 3(-435,56) 4(-326,56) 5(-217,56) 6(-109,56) 7(0,56) 8(109,56) 9(217,56) 10(326,56) 11(435,56) 12(543,56) 13(652,56) 14(-598,-56) 15(-489,-56) 16(-380,-56) 17(-272,-56) 18(-163,-56) 19(-54,-56) 20(54,-56) 21(163,-56) 22(272,-56) 23(380,-56) 24(489,-56) 25(598,-56)
Top Overlay:
  circle w6: c-926,-1 r65
  circle w6: c926,0 r65
  lines w6: -777,92 -746,-116 ; -776.68,88.67 cw(c-710,102) -710,170 710,170 cw(c710,101.99) 776.69,88.67 ; -762,92 -731,-116 ; -761.97,91.61 cw(c-710,102) -710,155 710,155 cw(c710,101.99) 761.79,90.7 ; -747.4,-110.99 ccw(c-680,-102) -680,-170 680,-170 ccw(c679.99,-102) 747.89,-105.7 ; -731.3,-115.33 ccw(c-680,-101.99) -680,-155 680,-155 ccw(c679.99,-102) 731.52,-114.37 ; 731,-115 762,91 ; 747,-113 777,91 ; -935,-245 -935,-240 -835,-240 -835,-245 ; -935,-245 -835,-245 ; -935,-245 -1020,-245 cw(c-1020,-220) -1045,-220 -1045,220 cw(c-1020,220) -1020,245 -935,245 ; -935,245 -935,240 -835,240 -835,245 ; -935,245 -835,245 ; -835,-245 835,-245 ; -835,245 835,245 ; 835,-245 835,-240 935,-240 935,-245 ; 835,-245 935,-245 ; 835,245 835,240 935,240 935,245 ; 835,245 935,245 ; 935,-245 1020,-245 ccw(c1020,-220) 1045,-220 1045,220 ccw(c1020,220) 1020,245 935,245
  text "1" at -660,95 h33.15
  text "2" at -555,95 h33.15
  text "3" at -450,95 h33.15
  text "4" at -345,95 h33.15
  text "5" at -235,95 h33.15
  text "6" at -125,95 h33.15
  text "7" at -15,95 h33.15
  text "8" at 95,95 h33.15
  text "9" at 200,95 h33.15
  text "10" at 300,95 h33.15
  text "11" at 405,95 h33.15
  text "12" at 510,95 h33.15
  text "13" at 625,95 h33.15
  text "14" at -630,-135 h33.15
  text "15" at -520,-135 h33.15
  text "16" at -410,-135 h33.15
  text "17" at -305,-135 h33.15
  text "18" at -200,-135 h33.15
  text "19" at -85,-135 h33.15
  text "20" at 20,-135 h33.15
  text "21" at 130,-135 h33.15
  text "22" at 240,-135 h33.15
  text "23" at 350,-135 h33.15
  text "24" at 455,-135 h33.15
  text "25" at 565,-135 h33.15
Mechanical 9 keep-out:
  circle w0: c926,0 r105
  circle w0: c-926,0 r105
Mechanical 10:
  circle w0: c926,0 r105
  circle w0: c-926,0 r105
Mechanical 16:
  circle w16: c-109,56 r10
  circle w16: c-163,-56 r10
  circle w16: c-217,56 r10
  circle w16: c0,56 r10
  circle w16: c-54,-56 r10
  circle w16: c54,-56 r10
  circle w16: c109,56 r10
  circle w16: c217,56 r10
  circle w16: c163,-56 r10
  circle w16: c272,-56 r10
  circle w16: c326,56 r10
  circle w16: c380,-56 r10
  circle w16: c435,56 r10
  circle w16: c489,-56 r10
  circle w16: c543,56 r10
  circle w16: c652,56 r10
  circle w16: c598,-56 r10
  circle w16: c-326,56 r10
  circle w16: c-272,-56 r10
  circle w16: c-380,-56 r10
  circle w16: c-435,56 r10
  circle w16: c-543,56 r10
  circle w16: c-652,56 r10
  circle w16: c-489,-56 r10
  circle w16: c-598,-56 r10

## M25VB [mil]
pads (25):
  oct 60x60 hole 40: 1(652,-56) 2(543,-56) 3(435,-56) 4(326,-56) 5(217,-56) 6(109,-56) 7(0,-56) 8(-109,-56) 9(-217,-56) 10(-326,-56) 11(-435,-56) 12(-543,-56) 13(-652,-56) 14(598,56) 15(489,56) 16(380,56) 17(272,56) 18(163,56) 19(54,56) 20(-54,56) 21(-163,56) 22(-272,56) 23(-380,56) 24(-489,56) 25(-598,56)
Top Overlay:
  lines w6: -777,-91 -747,113 ; -776.69,-88.67 ccw(c-710,-101.99) -710,-170 710,-170 ccw(c710,-102) 776.68,-88.67 ; -762,-91 -731,115 ; -761.79,-90.7 ccw(c-710,-101.99) -710,-155 710,-155 ccw(c710,-102) 761.97,-91.61 ; -747.89,105.7 cw(c-679.99,102) -680,170 680,170 cw(c680,102) 747.4,110.99 ; -731.52,114.37 cw(c-679.99,102) -680,155 680,155 cw(c680,101.99) 731.3,115.33 ; 731,116 762,-92 ; 746,116 777,-92 ; -935,-245 -1020,-245 cw(c-1020,-220) -1045,-220 -1045,220 cw(c-1020,220) -1020,245 -935,245 ; -935,-245 -935,-240 -835,-240 -835,-245 ; -935,-245 -835,-245 ; -935,245 -835,245 ; -935,245 -935,240 -835,240 -835,245 ; -835,-245 835,-245 ; -835,245 835,245 ; 835,-245 835,-240 935,-240 935,-245 ; 835,-245 935,-245 ; 835,245 935,245 ; 835,245 835,240 935,240 935,245 ; 935,-245 1020,-245 ccw(c1020,-220) 1045,-220 1045,220 ccw(c1020,220) 1020,245 935,245
  text "1" at 660,-95 h33.15
  text "2" at 555,-95 h33.15
  text "3" at 450,-95 h33.15
  text "4" at 345,-95 h33.15
  text "5" at 235,-95 h33.15
  text "6" at 125,-95 h33.15
  text "7" at 15,-95 h33.15
  text "8" at -95,-95 h33.15
  text "9" at -200,-95 h33.15
  text "10" at -300,-95 h33.15
  text "11" at -405,-95 h33.15
  text "12" at -510,-95 h33.15
  text "13" at -625,-95 h33.15
  text "14" at 630,135 h33.15
  text "15" at 520,135 h33.15
  text "16" at 410,135 h33.15
  text "17" at 305,135 h33.15
  text "18" at 200,135 h33.15
  text "19" at 85,135 h33.15
  text "20" at -20,135 h33.15
  text "21" at -130,135 h33.15
  text "22" at -240,135 h33.15
  text "23" at -350,135 h33.15
  text "24" at -455,135 h33.15
  text "25" at -565,135 h33.15
Mechanical 16:
  circle w16: c109,-56 r10
  circle w16: c163,56 r10
  circle w16: c217,-56 r10
  circle w16: c0,-56 r10
  circle w16: c54,56 r10
  circle w16: c-54,56 r10
  circle w16: c-109,-56 r10
  circle w16: c-217,-56 r10
  circle w16: c-163,56 r10
  circle w16: c-272,56 r10
  circle w16: c-326,-56 r10
  circle w16: c-380,56 r10
  circle w16: c-435,-56 r10
  circle w16: c-489,56 r10
  circle w16: c-543,-56 r10
  circle w16: c-652,-56 r10
  circle w16: c-598,56 r10
  circle w16: c326,-56 r10
  circle w16: c272,56 r10
  circle w16: c380,56 r10
  circle w16: c435,-56 r10
  circle w16: c543,-56 r10
  circle w16: c652,-56 r10
  circle w16: c489,56 r10
  circle w16: c598,56 r10

## M25VP [mil]
pads (27):
  oct 60x60 hole 40: 1(-652,56) 2(-543,56) 3(-435,56) 4(-326,56) 5(-217,56) 6(-109,56) 7(0,56) 8(109,56) 9(217,56) 10(326,56) 11(435,56) 12(543,56) 13(652,56) 14(-598,-56) 15(-489,-56) 16(-380,-56) 17(-272,-56) 18(-163,-56) 19(-54,-56) 20(54,-56) 21(163,-56) 22(272,-56) 23(380,-56) 24(489,-56) 25(598,-56)
  round 200 hole 130: G1(-926,0) G2(926,0)
Top Overlay:
  circle w6: c-926,-1 r65
  circle w6: c926,0 r65
  lines w6: -777,92 -746,-116 ; -776.68,88.67 cw(c-710,102) -710,170 710,170 cw(c710,101.99) 776.69,88.67 ; -762,92 -731,-116 ; -761.97,91.61 cw(c-710,102) -710,155 710,155 cw(c710,101.99) 761.79,90.7 ; -747.4,-110.99 ccw(c-680,-102) -680,-170 680,-170 ccw(c679.99,-102) 747.89,-105.7 ; -731.3,-115.33 ccw(c-680,-101.99) -680,-155 680,-155 ccw(c679.99,-102) 731.52,-114.37 ; 731,-115 762,91 ; 747,-113 777,91 ; -935,-245 -935,-240 -835,-240 -835,-245 ; -935,-245 -835,-245 ; -935,-245 -1020,-245 cw(c-1020,-220) -1045,-220 -1045,220 cw(c-1020,220) -1020,245 -935,245 ; -935,245 -935,240 -835,240 -835,245 ; -935,245 -835,245 ; -835,-245 835,-245 ; -835,245 835,245 ; 835,-245 835,-240 935,-240 935,-245 ; 835,-245 935,-245 ; 835,245 835,240 935,240 935,245 ; 835,245 935,245 ; 935,-245 1020,-245 ccw(c1020,-220) 1045,-220 1045,220 ccw(c1020,220) 1020,245 935,245
  text "1" at -660,95 h33.15
  text "2" at -555,95 h33.15
  text "3" at -450,95 h33.15
  text "4" at -345,95 h33.15
  text "5" at -235,95 h33.15
  text "6" at -125,95 h33.15
  text "7" at -15,95 h33.15
  text "8" at 95,95 h33.15
  text "9" at 200,95 h33.15
  text "10" at 300,95 h33.15
  text "11" at 405,95 h33.15
  text "12" at 510,95 h33.15
  text "13" at 625,95 h33.15
  text "14" at -630,-135 h33.15
  text "15" at -520,-135 h33.15
  text "16" at -410,-135 h33.15
  text "17" at -305,-135 h33.15
  text "18" at -200,-135 h33.15
  text "19" at -85,-135 h33.15
  text "20" at 20,-135 h33.15
  text "21" at 130,-135 h33.15
  text "22" at 240,-135 h33.15
  text "23" at 350,-135 h33.15
  text "24" at 455,-135 h33.15
  text "25" at 565,-135 h33.15
Mechanical 16:
  circle w16: c-109,56 r10
  circle w16: c-163,-56 r10
  circle w16: c-217,56 r10
  circle w16: c0,56 r10
  circle w16: c-54,-56 r10
  circle w16: c54,-56 r10
  circle w16: c109,56 r10
  circle w16: c217,56 r10
  circle w16: c163,-56 r10
  circle w16: c272,-56 r10
  circle w16: c326,56 r10
  circle w16: c380,-56 r10
  circle w16: c435,56 r10
  circle w16: c489,-56 r10
  circle w16: c543,56 r10
  circle w16: c652,56 r10
  circle w16: c598,-56 r10
  circle w16: c-326,56 r10
  circle w16: c-272,-56 r10
  circle w16: c-380,-56 r10
  circle w16: c-435,56 r10
  circle w16: c-543,56 r10
  circle w16: c-652,56 r10
  circle w16: c-489,-56 r10
  circle w16: c-598,-56 r10

## MICRO-SD-SOCKET-PP [mil]
pads (12):
  rect 70.87x55.12 smd: CD1(-80.71,15.75) CD2(-305.12,15.75)
  rect 31.5x59.06 smd: CS(-308.66,405.51) DI(-265.35,421.26) DO(-92.13,421.26) GND(-135.43,429.13) RSV1(-351.97,421.26) RSV2(-48.82,421.26) SCLK(-178.74,421.26) VCC(-222.05,429.13)
  rect 55.12x74.8 smd: GND1(-535.43,572.83) GND3(-17.72,533.46)
Top Overlay:
  lines w8: -551.18,519.69 -551.18,0 -358.27,0 ; -492.13,602.36 -460.63,602.36 cw(c-458.66,576.77) -433.07,574.8 ccw(c-392.72,575.78) -393.7,535.43 -62.99,535.43 ; -251.97,0 -133.86,0 ; -27.56,0 0,0 0,476.38
Mechanical 16:
  lines w8: -433.07,629.92 0,629.92 ; -433.07,692.91 0,692.91 ; -433.07,814.96 0,814.96
  text "Pressed" at 25,625 h42.5
  text "Locked" at 25,700 h42.5
  text "Unlocked" at 25,825 h42.5

## MICRO-SD-SOCKET-SDIO [mil]
pads (12):
  rect 70.87x55.12 smd: CD1(469.29,15.75) CD2(244.88,15.75)
  rect 31.5x59.06 smd: CD/DAT3(241.34,405.51) CLK(371.26,421.26) CMD(284.65,421.26) DAT0(457.87,421.26) DAT1(501.18,421.26) DAT2(198.03,421.26) GND(414.57,429.13) VCC(327.95,429.13)
  rect 55.12x74.8 smd: GND1(14.57,572.83) GND3(532.28,533.46)
Top Overlay:
  lines w8: -1.18,519.69 -1.18,0 191.73,0 ; 57.87,602.36 89.37,602.36 cw(c91.34,576.77) 116.93,574.8 ccw(c157.28,575.78) 156.3,535.43 487.01,535.43 ; 298.03,0 416.14,0 ; 522.44,0 550,0 550,476.38
Mechanical 16:
  lines w8: 116.93,629.92 550,629.92 ; 116.93,692.91 550,692.91 ; 116.93,814.96 550,814.96
  text "Pressed" at 575,625 h42.5
  text "Locked" at 575,700 h42.5
  text "Unlocked" at 575,825 h42.5